# Altium footprint library HeadersPin_1rows_M_90.PcbLib: 40 footprints (part 2 of 3)
Each footprint in its own frame and in the unit in brackets; x right, y up, seen from the top. Pads: shape width x height; smd on the part's side, far side on the other; paste and mask are expansions set on the pad; w line width, h text height; cw(c..) or ccw(c..) is an arc to the next point about the centre after c.
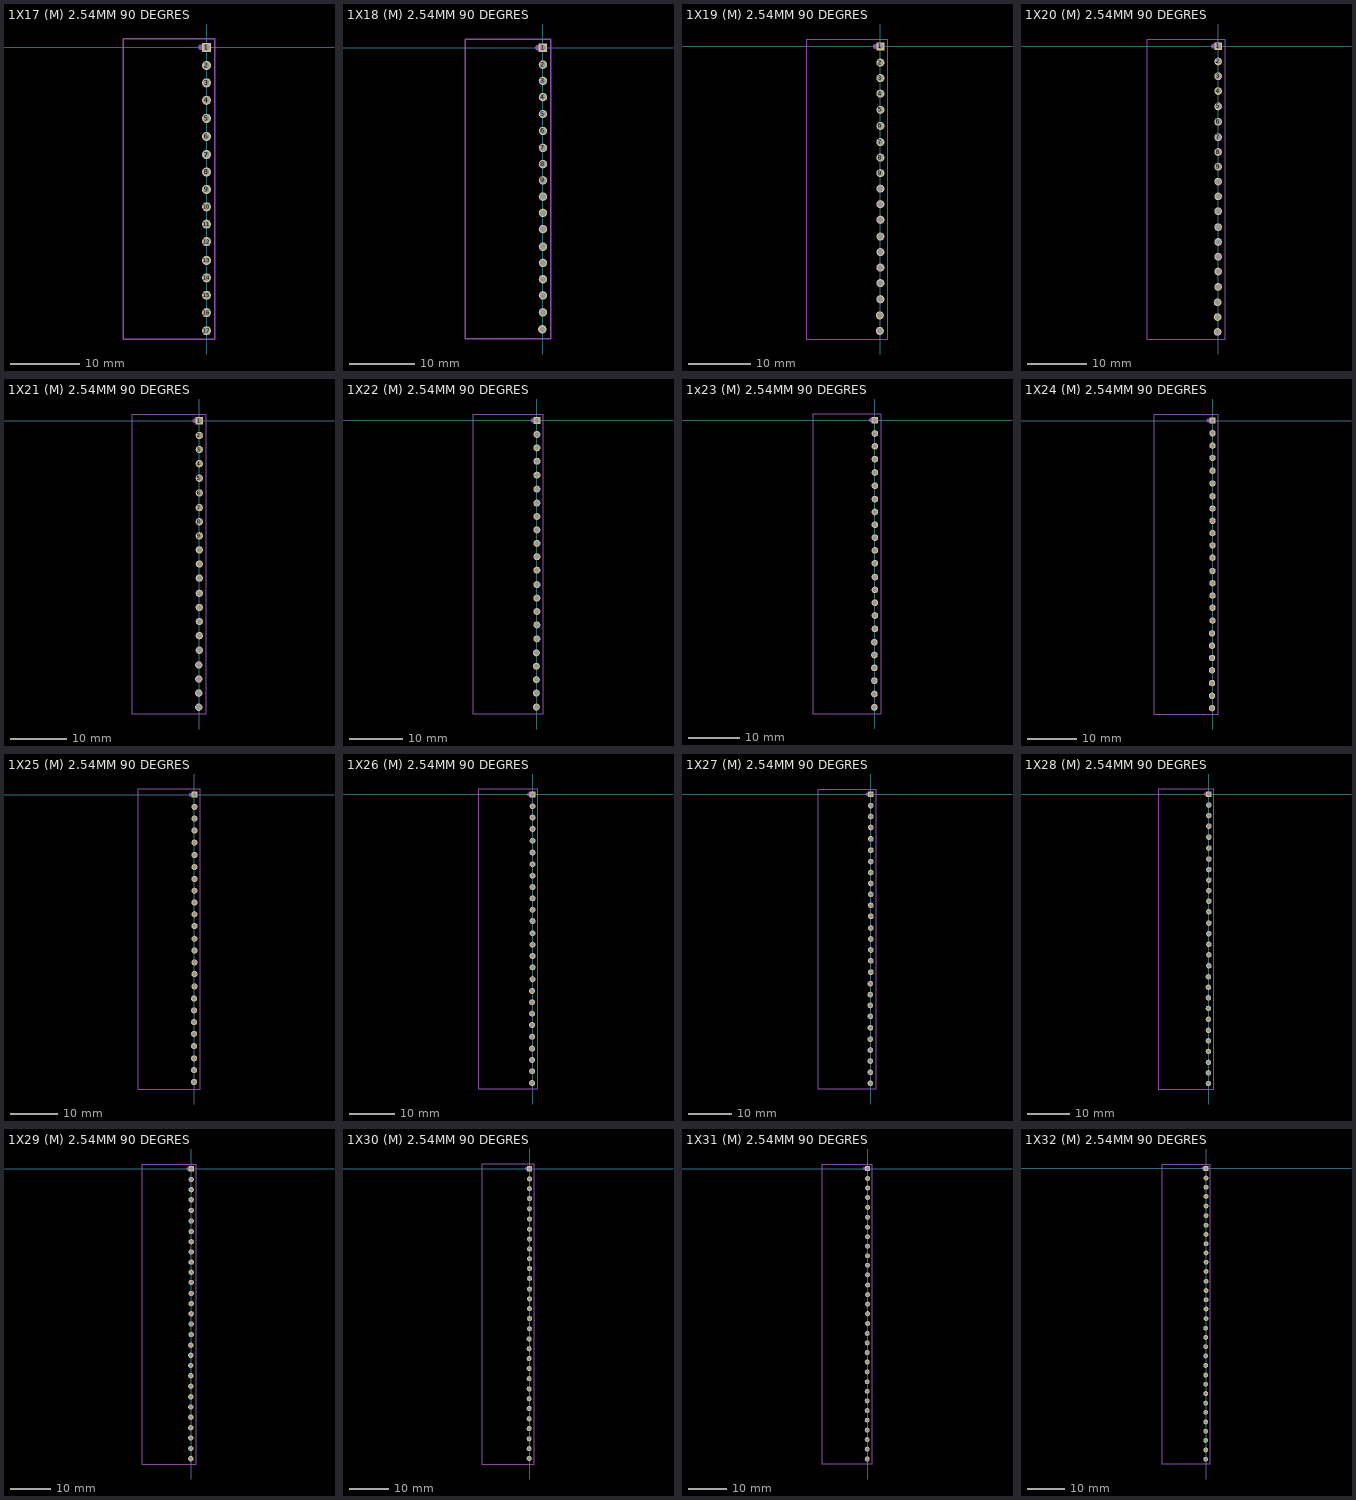
[diagram p1: the footprints below, top view; thin cyan lines are the x and y axes]

## 1X17 (M) 2.54MM 90 DEGRES [mm]
pads (17):
  rect 1.3x1.3 hole 0.9 mask+0.05: 1(0,0)
  round 1.3 hole 0.9 mask+0.05: 2(0,-2.6) 3(0,-5.1) 4(0,-7.6) 5(0,-10.2) 6(0,-12.8) 7(0,-15.4) 8(0,-17.9) 9(0,-20.4) 10(0,-22.9) 11(0,-25.4) 12(0,-27.9) 13(0,-30.6) 14(0,-33.1) 15(0,-35.6) 16(0,-38.1) 17(0,-40.7)
Mechanical 2:
  circle w0.4: c-0.8,0 r0.2
  lines w0.2: -11.981,-41.885 1.2,-41.885 1.2,1.2 -11.981,1.2 -11.981,-41.885
  text ".Designator" at -6.116,-19.936 h1.52
3D body "1x17 Male Pin Header Angle.STEP": height 2.65, standoff -2.85, extent -12.035,-41.9 0.325,1.285

## 1X18 (M) 2.54MM 90 DEGRES [mm]
pads (18):
  rect 1.3x1.3 hole 0.9 mask+0.05: 1(0,0)
  round 1.3 hole 0.9 mask+0.05: 2(0,-2.6) 3(0,-5.1) 4(0,-7.6) 5(0,-10.2) 6(0,-12.8) 7(0,-15.4) 8(0,-17.9) 9(0,-20.4) 10(0,-22.9) 11(0,-25.4) 12(0,-27.9) 13(0,-30.6) 14(0,-33.1) 15(0,-35.6) 16(0,-38.1) 17(0,-40.7) 18(-0.1,-43.3)
Mechanical 2:
  circle w0.4: c-0.8,0 r0.2
  lines w0.2: -11.958,-44.8 1.2,-44.8 1.2,1.341 -11.958,1.341 -11.958,-44.8
  text ".Designator" at -7.097,-16.401 h1.52
3D body "1x18 Male Pin Header Angle.STEP": height 2.65, standoff -2.85, extent -12.093,-44.44 0.267,1.285

## 1X19 (M) 2.54MM 90 DEGRES [mm]
pads (19):
  rect 1.3x1.3 hole 0.9 mask+0.05: 1(0,0)
  round 1.3 hole 0.9 mask+0.05: 2(0,-2.6) 3(0,-5.1) 4(0,-7.6) 5(0,-10.2) 6(0,-12.8) 7(0,-15.4) 8(0,-17.9) 9(0,-20.4) 10(0,-22.9) 11(0,-25.4) 12(0,-27.9) 13(0,-30.6) 14(0,-33.1) 15(0,-35.6) 16(0,-38.1) 17(0,-40.7) 18(-0.1,-43.3) 19(-0.1,-45.8)
Mechanical 2:
  circle w0.4: c-0.8,0 r0.2
  lines w0.2: -11.958,-47.1 -11.958,1.2 1.2,1.2 1.2,-47.1 -11.958,-47.1
  text ".Designator" at -4.805,-19.299 h1.52
3D body "1x19 Male Pin Header Angle.STEP": height 2.65, standoff -2.85, extent -12.006,-47.031 0.355,1.235

## 1X20 (M) 2.54MM 90 DEGRES [mm]
pads (20):
  rect 1.3x1.3 hole 0.9 mask+0.05: 1(0,0)
  round 1.3 hole 0.9 mask+0.05: 2(0,-2.6) 3(0,-5.1) 4(0,-7.6) 5(0,-10.2) 6(0,-12.8) 7(0,-15.4) 8(0,-17.9) 9(0,-20.4) 10(0,-22.9) 11(0,-25.4) 12(0,-27.9) 13(0,-30.6) 14(0,-33.1) 15(0,-35.6) 16(0,-38.1) 17(0,-40.7) 18(-0.1,-43.3) 19(-0.1,-45.8) 20(-0.1,-48.3)
Mechanical 2:
  circle w0.4: c-0.8,0 r0.2
  lines w0.2: -12.075,-49.5 -12.075,1.2 1.2,1.2 1.2,-49.5 -12.075,-49.5
  text ".Designator" at -4.402,-17.607 h1.52
3D body "1x20 Male Pin Header Angle.STEP": height 2.65, standoff -2.85, extent -12.061,-49.619 0.299,1.186

## 1X21 (M) 2.54MM 90 DEGRES [mm]
pads (21):
  rect 1.3x1.3 hole 0.9 mask+0.05: 1(0,0)
  round 1.3 hole 0.9 mask+0.05: 2(0,-2.6) 3(0,-5.1) 4(0,-7.6) 5(0,-10.2) 6(0,-12.8) 7(0,-15.4) 8(0,-17.9) 9(0,-20.4) 10(0,-22.9) 11(0,-25.4) 12(0,-27.9) 13(0,-30.6) 14(0,-33.1) 15(0,-35.6) 16(0,-38.1) 17(0,-40.7) 18(-0.1,-43.3) 19(-0.1,-45.8) 20(-0.1,-48.3) 21(-0.1,-50.8)
Mechanical 2:
  circle w0.4: c-0.8,0 r0.2
  lines w0.2: -11.953,-52 -11.953,1.2 1.2,1.2 1.2,-52 -11.953,-52
  text ".Designator" at -5.882,-16.091 h1.52
3D body "1x21 Male Pin Header Angle.STEP": height 2.65, standoff -2.85, extent -12.009,-52.118 0.351,1.227

## 1X22 (M) 2.54MM 90 DEGRES [mm]
pads (22):
  rect 1.3x1.3 hole 0.9 mask+0.05: 1(0,0)
  round 1.3 hole 0.9 mask+0.05: 2(0,-2.6) 3(0,-5.1) 4(0,-7.6) 5(0,-10.2) 6(0,-12.8) 7(0,-15.4) 8(0,-17.9) 9(0,-20.4) 10(0,-22.9) 11(0,-25.4) 12(0,-27.9) 13(0,-30.6) 14(0,-33.1) 15(0,-35.6) 16(0,-38.1) 17(0,-40.7) 18(-0.1,-43.3) 19(-0.1,-45.8) 20(-0.1,-48.3) 21(-0.1,-50.8) 22(-0.1,-53.4)
Mechanical 2:
  circle w0.4: c-0.8,0 r0.2
  lines w0.2: -11.971,-54.7 -11.971,1.2 1.2,1.2 1.2,-54.7 -11.971,-54.7
  text ".Designator" at -5.443,-18.242 h1.52
3D body "1x22 Male Pin Header Angle.STEP": height 2.65, standoff -2.85, extent -12.032,-54.59 0.328,1.295

## 1x23 (M) 2.54MM 90 DEGRES [mm]
pads (23):
  rect 1.3x1.3 hole 0.9 mask+0.05: 1(0,0)
  round 1.3 hole 0.9 mask+0.05: 2(0,-2.6) 3(0,-5.1) 4(0,-7.6) 5(0,-10.2) 6(0,-12.8) 7(0,-15.4) 8(0,-17.9) 9(0,-20.4) 10(0,-22.9) 11(0,-25.4) 12(0,-27.9) 13(0,-30.6) 14(0,-33.1) 15(0,-35.6) 16(0,-38.1) 17(0,-40.7) 18(-0.1,-43.3) 19(-0.1,-45.8) 20(-0.1,-48.3) 21(-0.1,-50.8) 22(-0.1,-53.4) 23(-0.1,-56)
Mechanical 2:
  circle w0.4: c-0.8,0 r0.2
  lines w0.2: -12.075,-57.3 1.2,-57.3 1.2,1.2 -12.075,1.2 -12.075,-57.3
  text ".Designator" at -4.996,-15.243 h1.52
3D body "1x23 Male Pin Header Angle.STEP": height 2.65, standoff -2.85, extent -12.018,-57.163 0.342,1.263

## 1X24 (M) 2.54MM 90 DEGRES [mm]
pads (24):
  rect 1.3x1.3 hole 0.9 mask+0.05: 1(0,0)
  round 1.3 hole 0.9 mask+0.05: 2(0,-2.6) 3(0,-5.1) 4(0,-7.6) 5(0,-10.2) 6(0,-12.8) 7(0,-15.4) 8(0,-17.9) 9(0,-20.4) 10(0,-22.9) 11(0,-25.4) 12(0,-27.9) 13(0,-30.6) 14(0,-33.1) 15(0,-35.6) 16(0,-38.1) 17(0,-40.7) 18(-0.1,-43.3) 19(-0.1,-45.8) 20(-0.1,-48.3) 21(-0.1,-50.8) 22(-0.1,-53.4) 23(-0.1,-56) 24(-0.1,-58.5)
Mechanical 2:
  circle w0.4: c-0.8,0 r0.2
  lines w0.2: -11.991,-59.7 1.2,-59.7 1.2,1.331 -11.991,1.331 -11.991,-59.7
  text ".Designator" at -4.285,-13.94 h1.52
3D body "1x24 Male Pin Header Angle.STEP": height 2.65, standoff -2.85, extent -11.988,-59.657 0.372,1.308

## 1X25 (M) 2.54MM 90 DEGRES [mm]
pads (25):
  rect 1.3x1.3 hole 0.9 mask+0.05: 1(0,0)
  round 1.3 hole 0.9 mask+0.05: 2(0,-2.6) 3(0,-5.1) 4(0,-7.6) 5(0,-10.2) 6(0,-12.8) 7(0,-15.4) 8(0,-17.9) 9(0,-20.4) 10(0,-22.9) 11(0,-25.4) 12(0,-27.9) 13(0,-30.6) 14(0,-33.1) 15(0,-35.6) 16(0,-38.1) 17(0,-40.7) 18(-0.1,-43.3) 19(-0.1,-45.8) 20(-0.1,-48.3) 21(-0.1,-50.8) 22(-0.1,-53.4) 23(-0.1,-56) 24(-0.1,-58.5) 25(-0.1,-61)
Mechanical 2:
  circle w0.4: c-0.8,0 r0.2
  lines w0.2: -12.027,-62.5 -12.027,1.2 1.2,1.2 1.2,-62.5 -12.027,-62.5
  text ".Designator" at -5.799,-15.184 h1.52
3D body "1x25 Male Pin Header Angle.STEP": height 2.65, standoff -2.85, extent -12.061,-62.283 0.299,1.222

## 1X26 (M) 2.54MM 90 DEGRES [mm]
pads (26):
  rect 1.3x1.3 hole 0.9 mask+0.05: 1(0,0)
  round 1.3 hole 0.9 mask+0.05: 2(0,-2.6) 3(0,-5.1) 4(0,-7.6) 5(0,-10.2) 6(0,-12.8) 7(0,-15.4) 8(0,-17.9) 9(0,-20.4) 10(0,-22.9) 11(0,-25.4) 12(0,-27.9) 13(0,-30.6) 14(0,-33.1) 15(0,-35.6) 16(0,-38.1) 17(0,-40.7) 18(-0.1,-43.3) 19(-0.1,-45.8) 20(-0.1,-48.3) 21(-0.1,-50.8) 22(-0.1,-53.4) 23(-0.1,-56) 24(-0.1,-58.5) 25(-0.1,-61) 26(-0.1,-63.6)
Mechanical 2:
  circle w0.4: c-0.8,0 r0.2
  lines w0.2: -12.017,-64.9 -12.017,1.2 1.2,1.2 1.2,-64.9 -12.017,-64.9
  text ".Designator" at -5.161,-16.794 h1.52
3D body "1x26 Male Pin Header Angle.STEP": height 2.65, standoff -2.85, extent -12.088,-64.8 0.272,1.245

## 1X27 (M) 2.54MM 90 DEGRES [mm]
pads (27):
  rect 1.3x1.3 hole 0.9 mask+0.05: 1(0,0)
  round 1.3 hole 0.9 mask+0.05: 2(0,-2.6) 3(0,-5.1) 4(0,-7.6) 5(0,-10.2) 6(0,-12.8) 7(0,-15.4) 8(0,-17.9) 9(0,-20.4) 10(0,-22.9) 11(0,-25.4) 12(0,-27.9) 13(0,-30.6) 14(0,-33.1) 15(0,-35.6) 16(0,-38.1) 17(0,-40.7) 18(-0.1,-43.3) 19(-0.1,-45.8) 20(-0.1,-48.3) 21(-0.1,-50.8) 22(-0.1,-53.4) 23(-0.1,-56) 24(-0.1,-58.5) 25(-0.1,-61) 26(-0.1,-63.6) 27(-0.1,-66.1)
Mechanical 2:
  circle w0.4: c-0.8,0 r0.2
  lines w0.2: -12.093,-67.4 1.2,-67.4 1.2,1.2 -12.093,1.2 -12.093,-67.4
  text ".Designator" at -7.079,-22.878 h1.52
3D body "1x27 Male Pin Header Angle.STEP": height 2.65, standoff -2.85, extent -11.999,-67.277 0.361,1.308

## 1X28 (M) 2.54MM 90 DEGRES [mm]
pads (28):
  rect 1.3x1.3 hole 0.9 mask+0.05: 1(0,0)
  round 1.3 hole 0.9 mask+0.05: 2(0,-2.6) 3(0,-5.1) 4(0,-7.6) 5(0,-10.2) 6(0,-12.8) 7(0,-15.4) 8(0,-17.9) 9(0,-20.4) 10(0,-22.9) 11(0,-25.4) 12(0,-27.9) 13(0,-30.6) 14(0,-33.1) 15(0,-35.6) 16(0,-38.1) 17(0,-40.7) 18(-0.1,-43.3) 19(-0.1,-45.8) 20(-0.1,-48.3) 21(-0.1,-50.8) 22(-0.1,-53.4) 23(-0.1,-56) 24(-0.1,-58.5) 25(-0.1,-61) 26(-0.1,-63.6) 27(-0.1,-66.1) 28(-0.1,-68.6)
Mechanical 2:
  circle w0.4: c-0.8,0 r0.2
  lines w0.2: -12.05,-69.9 1.2,-69.9 1.2,1.2 -12.05,1.2 -12.05,-69.9
  text ".Designator" at -6.136,-16.172 h1.52
3D body "1x28 Male Pin Header Angle.STEP": height 2.65, standoff -2.85, extent -12.006,-69.852 0.354,1.273

## 1X29 (M) 2.54MM 90 DEGRES [mm]
pads (29):
  rect 1.3x1.3 hole 0.9 mask+0.05: 1(0,0)
  round 1.3 hole 0.9 mask+0.05: 2(0,-2.6) 3(0,-5.1) 4(0,-7.6) 5(0,-10.2) 6(0,-12.8) 7(0,-15.4) 8(0,-17.9) 9(0,-20.4) 10(0,-22.9) 11(0,-25.4) 12(0,-27.9) 13(0,-30.6) 14(0,-33.1) 15(0,-35.6) 16(0,-38.1) 17(0,-40.7) 18(-0.1,-43.3) 19(-0.1,-45.8) 20(-0.1,-48.3) 21(-0.1,-50.8) 22(-0.1,-53.4) 23(-0.1,-56) 24(-0.1,-58.5) 25(-0.1,-61) 26(-0.1,-63.6) 27(-0.1,-66.1) 28(-0.1,-68.7) 29(-0.1,-71.2)
Mechanical 2:
  circle w0.4: c-0.8,0 r0.2
  lines w0.2: -12.106,-72.5 1.2,-72.5 1.2,1.2 -12.106,1.2 -12.106,-72.5
  text ".Designator" at -6.423,-15.471 h1.52
3D body "1x29 Male Pin Header Angle.STEP": height 2.65, standoff -2.85, extent -12.027,-72.392 0.333,1.273

## 1X30 (M) 2.54MM 90 DEGRES [mm]
pads (30):
  rect 1.3x1.3 hole 0.9 mask+0.05: 1(0,0)
  round 1.3 hole 0.9 mask+0.05: 2(0,-2.6) 3(0,-5.1) 4(0,-7.6) 5(0,-10.2) 6(0,-12.8) 7(0,-15.4) 8(0,-17.9) 9(0,-20.4) 10(0,-22.9) 11(0,-25.4) 12(0,-27.9) 13(0,-30.6) 14(0,-33.1) 15(0,-35.6) 16(0,-38.1) 17(0,-40.7) 18(-0.1,-43.3) 19(-0.1,-45.8) 20(-0.1,-48.3) 21(-0.1,-50.8) 22(-0.1,-53.4) 23(-0.1,-56) 24(-0.1,-58.5) 25(-0.1,-61) 26(-0.1,-63.6) 27(-0.1,-66.1) 28(-0.1,-68.7) 29(-0.1,-71.2) 30(-0.1,-73.7)
Mechanical 2:
  circle w0.4: c-0.8,0 r0.2
  lines w0.2: -12.149,-75.1 -12.149,1.2 1.2,1.2 1.2,-75.1 -12.149,-75.1
  text ".Designator" at -5.811,-15.751 h1.52
3D body "1x30 Male Pin Header Angle.STEP": height 2.65, standoff -2.85, extent -12.092,-74.948 0.268,1.257

## 1X31 (M) 2.54MM 90 DEGRES [mm]
pads (31):
  rect 1.3x1.3 hole 0.9 mask+0.05: 1(0,0)
  round 1.3 hole 0.9 mask+0.05: 2(0,-2.6) 3(0,-5.1) 4(0,-7.6) 5(0,-10.2) 6(0,-12.8) 7(0,-15.4) 8(0,-17.9) 9(0,-20.4) 10(0,-22.9) 11(0,-25.4) 12(0,-27.9) 13(0,-30.6) 14(0,-33.1) 15(0,-35.6) 16(0,-38.1) 17(0,-40.7) 18(-0.1,-43.3) 19(-0.1,-45.8) 20(-0.1,-48.3) 21(-0.1,-50.8) 22(-0.1,-53.4) 23(-0.1,-56) 24(-0.1,-58.5) 25(-0.1,-61) 26(-0.1,-63.6) 27(-0.1,-66.1) 28(-0.1,-68.7) 29(-0.1,-71.2) 30(-0.1,-73.7) 31(-0.1,-76.3)
Mechanical 2:
  circle w0.4: c-0.8,0 r0.2
  lines w0.2: -12.022,-77.6 1.2,-77.6 1.2,1.2 -12.022,1.2 -12.022,-77.6
  text ".Designator" at -4.394,-16.985 h1.52
3D body "1x31 Male Pin Header Angle.STEP": height 2.65, standoff -2.85, extent -12.008,-77.536 0.352,1.209

## 1X32 (M) 2.54MM 90 DEGRES [mm]
pads (32):
  rect 1.3x1.3 hole 0.9 mask+0.05: 1(0,0)
  round 1.3 hole 0.9 mask+0.05: 2(0,-2.6) 3(0,-5.1) 4(0,-7.6) 5(0,-10.2) 6(0,-12.8) 7(0,-15.4) 8(0,-17.9) 9(0,-20.4) 10(0,-22.9) 11(0,-25.4) 12(0,-27.9) 13(0,-30.6) 14(0,-33.1) 15(0,-35.6) 16(0,-38.1) 17(0,-40.7) 18(-0.1,-43.3) 19(-0.1,-45.8) 20(-0.1,-48.3) 21(-0.1,-50.8) 22(-0.1,-53.4) 23(-0.1,-56) 24(-0.1,-58.5) 25(-0.1,-61) 26(-0.1,-63.6) 27(-0.1,-66.1) 28(-0.1,-68.7) 29(-0.1,-71.2) 30(-0.1,-73.7) 31(-0.1,-76.3) 32(-0.1,-78.8)
Mechanical 2:
  circle w0.4: c-0.8,0 r0.2
  lines w0.2: -12.073,-80.1 -12.073,1.2 1.2,1.2 1.2,-80.1 -12.073,-80.1
  text ".Designator" at -6.492,-19.545 h1.52
3D body "1x32 Male Pin Header Angle.STEP": height 2.65, standoff -2.85, extent -12.039,-80.086 0.321,1.199